# Altium integrated library WR-FPC_rev19a.IntLib: 242 symbols (part 2 of 2) (continued)
## 687130182122
designator J?
WR-FPC SMT ZIF Horizontal Dual Contact, pitch 0.5mm, 30p; Part Number: 687130182122; Contact Resistance: 30mOhm; Pin Number: 30; Working Voltage: 50VAC; Rated Current: 0.5A; ComponentLink1Description: Manufacturer; ComponentLink1URL: http://www.we-online.de; ComponentLink2Description: Datasheet; ComponentLink2URL: https://katalog.we-online.com/em/datasheet/687130182122.pdf; Packaging: Tape and Reel; Pitch: 0.5mm; Published Date: November 2019; Mounting Technology: SMT; Operating Temperature: -25 to +85degC; Length: 17mm; Type: Horizontal; Publisher: Wurth Elektronik
footprint 687130182122
pins: 1, 2, 3, 4, 5, 6, 7, 8, 9, 10, 11, 12, 13, 14, 15, 16, 17, 18, 19, 20, 21, 22, 23, 24, 25, 26, 27, 28, 29, 30, MP1, MP2

## 687130183622
designator J?
WR-FPC SMT ZIF Horizontal Top Contact Low Profile, pitch 0.5mm, 30p; Part Number: 687130183622; Contact Resistance: 30mOhm; Pin Number: 30; Working Voltage: 50VAC; Rated Current: 0.4A; ComponentLink1Description: Manufacturer; ComponentLink1URL: http://www.we-online.de; ComponentLink2Description: Datasheet; ComponentLink2URL: https://katalog.we-online.com/em/datasheet/687130183622.pdf; Packaging: Tape and Reel; Pitch: 0.5mm; Published Date: November 2019; Mounting Technology: SMT; Operating Temperature: -25 to +85degC; Length: 20.7mm; Type: Horizontal; Publisher: Wurth Elektronik
footprint 687130183622
pins: 1, 2, 3, 4, 5, 6, 7, 8, 9, 10, 11, 12, 13, 14, 15, 16, 17, 18, 19, 20, 21, 22, 23, 24, 25, 26, 27, 28, 29, 30, MP1, MP2

## 687130183722
designator J?
WR-FPC SMT ZIF Horizontal Bottom Contact Low Profile, pitch 0.5mm, 30p; Part Number: 687130183722; Contact Resistance: 30mOhm; Pin Number: 30; Working Voltage: 50VAC; Rated Current: 0.4A; ComponentLink1Description: Manufacturer; ComponentLink1URL: http://www.we-online.de; ComponentLink2Description: Datasheet; ComponentLink2URL: https://katalog.we-online.com/em/datasheet/687130183722.pdf; Packaging: Tape and Reel; Pitch: 0.5mm; Published Date: November 2019; Mounting Technology: SMT; Operating Temperature: -25 to +85degC; Length: 20.7mm; Type: Horizontal; Publisher: Wurth Elektronik
footprint 687130183722
pins: 1, 2, 3, 4, 5, 6, 7, 8, 9, 10, 11, 12, 13, 14, 15, 16, 17, 18, 19, 20, 21, 22, 23, 24, 25, 26, 27, 28, 29, 30, MP1, MP2

## 687132149022
designator J?
WR-FPC SMT ZIF Horizontal Bottom Contact, pitch 0.5mm, 32p; Part Number: 687132149022; Contact Resistance: 50mOhm; Pin Number: 32; Working Voltage: 50VAC; Rated Current: 0.5A; ComponentLink1Description: Manufacturer; ComponentLink1URL: http://www.we-online.de; ComponentLink2Description: Datasheet; ComponentLink2URL: https://katalog.we-online.com/em/datasheet/687132149022.pdf; Packaging: Tape and Reel; Pitch: 0.5mm; Published Date: November 2019; Mounting Technology: SMT; Operating Temperature: -25 to +85degC; Length: 20.1mm; Type: Horizontal; Publisher: Wurth Elektronik
footprint 687132149022
pins: 1, 2, 3, 4, 5, 6, 7, 8, 9, 10, 11, 12, 13, 14, 15, 16, 17, 18, 19, 20, 21, 22, 23, 24, 25, 26, 27, 28, 29, 30, 31, 32, MP1, MP2

## 687132183622
designator J?
WR-FPC SMT ZIF Horizontal Top Contact Low Profile, pitch 0.5mm, 32p; Part Number: 687132183622; Contact Resistance: 30mOhm; Pin Number: 32; Working Voltage: 50VAC; Rated Current: 0.4A; ComponentLink1Description: Manufacturer; ComponentLink1URL: http://www.we-online.de; ComponentLink2Description: Datasheet; ComponentLink2URL: https://katalog.we-online.com/em/datasheet/687132183622.pdf; Packaging: Tape and Reel; Pitch: 0.5mm; Published Date: November 2019; Mounting Technology: SMT; Operating Temperature: -25 to +85degC; Length: 21.7mm; Type: Horizontal; Publisher: Wurth Elektronik
footprint 687132183622
pins: 1, 2, 3, 4, 5, 6, 7, 8, 9, 10, 11, 12, 13, 14, 15, 16, 17, 18, 19, 20, 21, 22, 23, 24, 25, 26, 27, 28, 29, 30, 31, 32, MP1, MP2

## 687132183722
designator J?
WR-FPC SMT ZIF Horizontal Bottom Contact Low Profile, pitch 0.5mm, 32p; Part Number: 687132183722; Contact Resistance: 30mOhm; Pin Number: 32; Working Voltage: 50VAC; Rated Current: 0.4A; ComponentLink1Description: Manufacturer; ComponentLink1URL: http://www.we-online.de; ComponentLink2Description: Datasheet; ComponentLink2URL: https://katalog.we-online.com/em/datasheet/687132183722.pdf; Packaging: Tape and Reel; Pitch: 0.5mm; Published Date: November 2019; Mounting Technology: SMT; Operating Temperature: -25 to +85degC; Length: 21.7mm; Type: Horizontal; Publisher: Wurth Elektronik
footprint 687132183722
pins: 1, 2, 3, 4, 5, 6, 7, 8, 9, 10, 11, 12, 13, 14, 15, 16, 17, 18, 19, 20, 21, 22, 23, 24, 25, 26, 27, 28, 29, 30, 31, 32, MP1, MP2

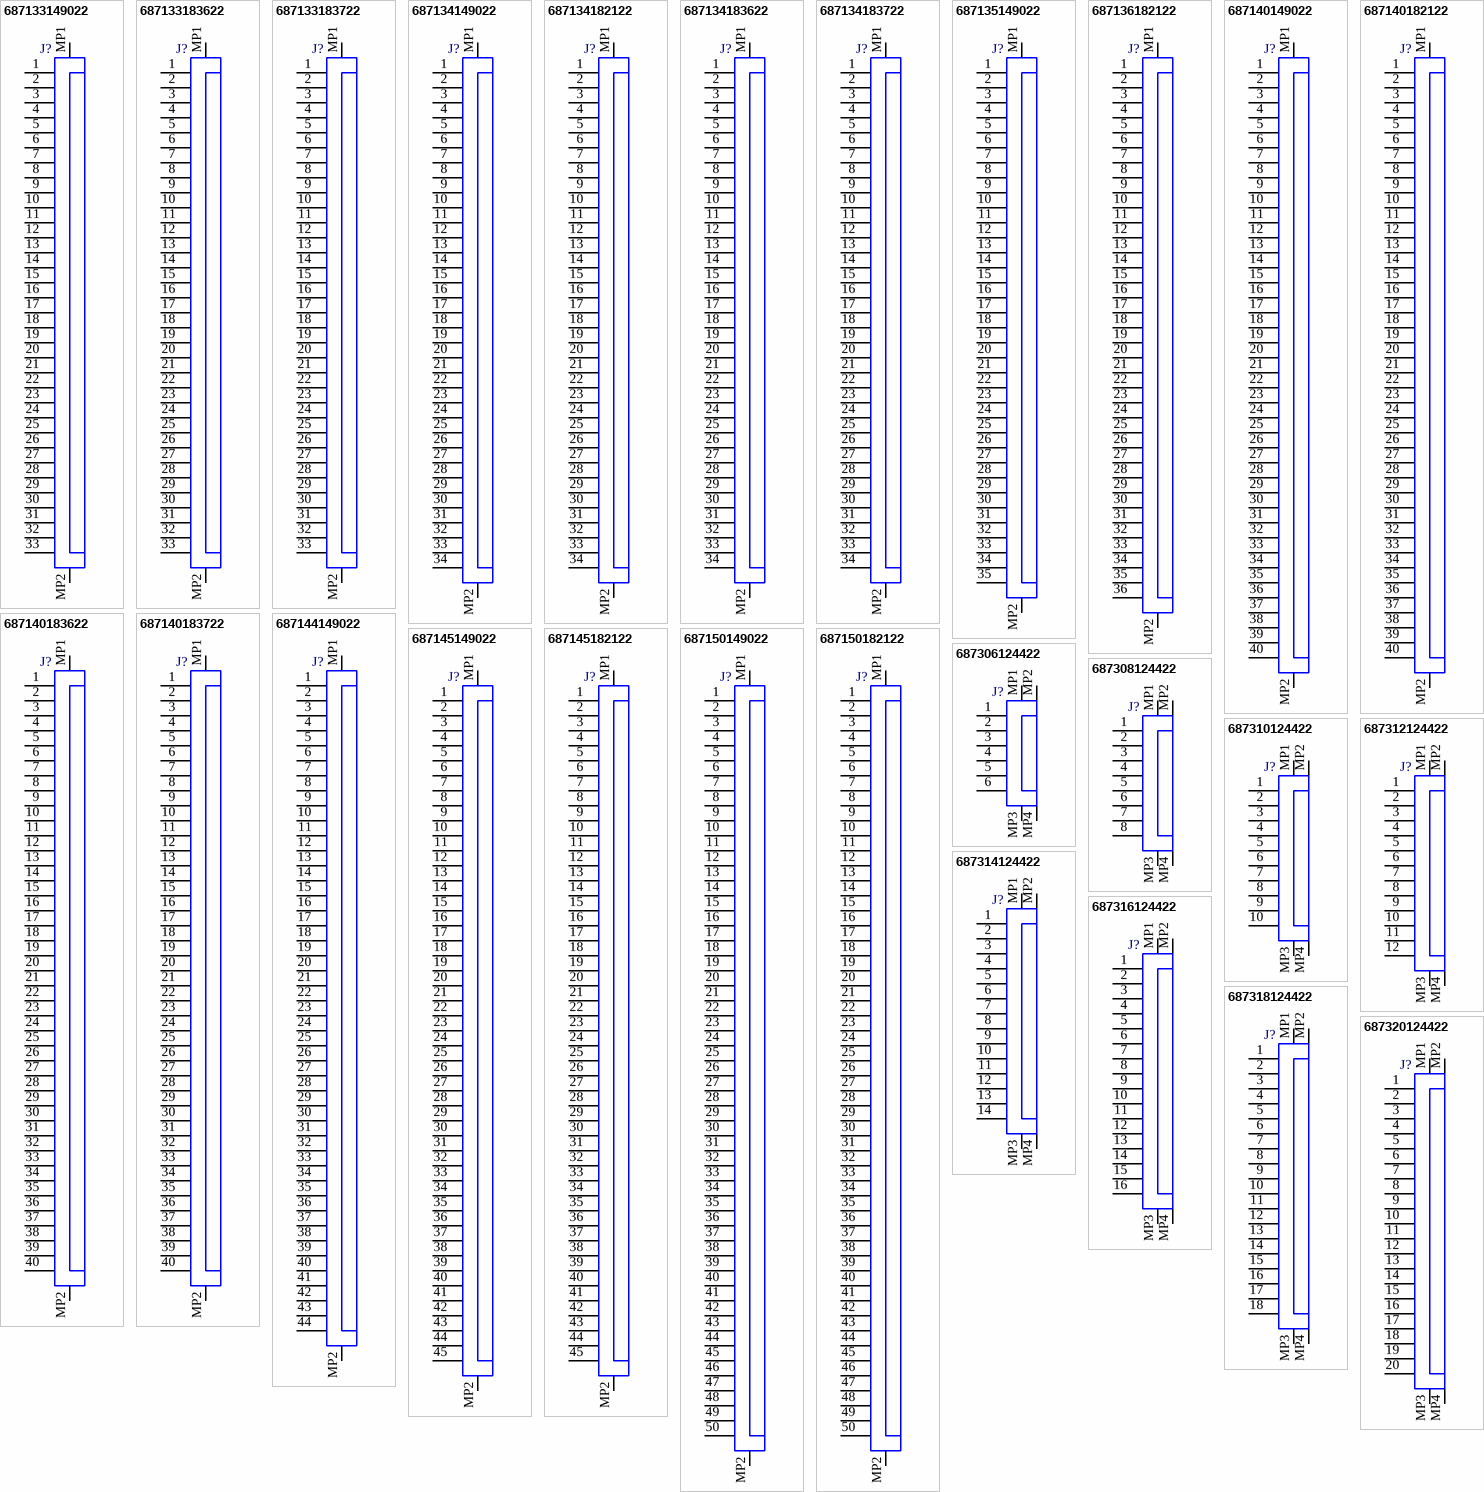
[diagram p6: symbols 687133149022 to 687320124422]

## 687133149022
designator J?
WR-FPC SMT ZIF Horizontal Bottom Contact, pitch 0.5mm, 33p; Part Number: 687133149022; Contact Resistance: 50mOhm; Pin Number: 33; Working Voltage: 50VAC; Rated Current: 0.5A; ComponentLink1Description: Manufacturer; ComponentLink1URL: http://www.we-online.de; ComponentLink2Description: Datasheet; ComponentLink2URL: https://katalog.we-online.com/em/datasheet/687133149022.pdf; Packaging: Tape and Reel; Pitch: 0.5mm; Published Date: November 2019; Mounting Technology: SMT; Operating Temperature: -25 to +85degC; Length: 20.6mm; Type: Horizontal; Publisher: Wurth Elektronik
footprint 687133149022
pins: 1, 2, 3, 4, 5, 6, 7, 8, 9, 10, 11, 12, 13, 14, 15, 16, 17, 18, 19, 20, 21, 22, 23, 24, 25, 26, 27, 28, 29, 30, 31, 32, 33, MP1, MP2

## 687133183622
designator J?
WR-FPC SMT ZIF Horizontal Top Contact Low Profile, pitch 0.5mm, 33p; Part Number: 687133183622; Contact Resistance: 30mOhm; Pin Number: 33; Working Voltage: 50VAC; Rated Current: 0.4A; ComponentLink1Description: Manufacturer; ComponentLink1URL: http://www.we-online.de; ComponentLink2Description: Datasheet; ComponentLink2URL: https://katalog.we-online.com/em/datasheet/687133183622.pdf; Packaging: Tape and Reel; Pitch: 0.5mm; Published Date: November 2019; Mounting Technology: SMT; Operating Temperature: -25 to +85degC; Length: 22.2mm; Type: Horizontal; Publisher: Wurth Elektronik
footprint 687133183622
pins: 1, 2, 3, 4, 5, 6, 7, 8, 9, 10, 11, 12, 13, 14, 15, 16, 17, 18, 19, 20, 21, 22, 23, 24, 25, 26, 27, 28, 29, 30, 31, 32, 33, MP1, MP2

## 687133183722
designator J?
WR-FPC SMT ZIF Horizontal Bottom Contact Low Profile, pitch 0.5mm, 33p; Part Number: 687133183722; Contact Resistance: 30mOhm; Pin Number: 33; Working Voltage: 50VAC; Rated Current: 0.4A; ComponentLink1Description: Manufacturer; ComponentLink1URL: http://www.we-online.de; ComponentLink2Description: Datasheet; ComponentLink2URL: https://katalog.we-online.com/em/datasheet/687133183722.pdf; Packaging: Tape and Reel; Pitch: 0.5mm; Published Date: November 2019; Mounting Technology: SMT; Operating Temperature: -25 to +85degC; Length: 22.2mm; Type: Horizontal; Publisher: Wurth Elektronik
footprint 687133183722
pins: 1, 2, 3, 4, 5, 6, 7, 8, 9, 10, 11, 12, 13, 14, 15, 16, 17, 18, 19, 20, 21, 22, 23, 24, 25, 26, 27, 28, 29, 30, 31, 32, 33, MP1, MP2

## 687134149022
designator J?
WR-FPC SMT ZIF Horizontal Bottom Contact, pitch 0.5mm, 34p; Part Number: 687134149022; Contact Resistance: 50mOhm; Pin Number: 34; Working Voltage: 50VAC; Rated Current: 0.5A; ComponentLink1Description: Manufacturer; ComponentLink1URL: http://www.we-online.de; ComponentLink2Description: Datasheet; ComponentLink2URL: https://katalog.we-online.com/em/datasheet/687134149022.pdf; Packaging: Tape and Reel; Pitch: 0.5mm; Published Date: November 2019; Mounting Technology: SMT; Operating Temperature: -25 to +85degC; Length: 21.1mm; Type: Horizontal; Publisher: Wurth Elektronik
footprint 687134149022
pins: 1, 2, 3, 4, 5, 6, 7, 8, 9, 10, 11, 12, 13, 14, 15, 16, 17, 18, 19, 20, 21, 22, 23, 24, 25, 26, 27, 28, 29, 30, 31, 32, 33, 34, MP1, MP2

## 687134182122
designator J?
WR-FPC SMT ZIF Horizontal Dual Contact, pitch 0.5mm, 34p; Part Number: 687134182122; Contact Resistance: 30mOhm; Pin Number: 34; Working Voltage: 50VAC; Rated Current: 0.5A; ComponentLink1Description: Manufacturer; ComponentLink1URL: http://www.we-online.de; ComponentLink2Description: Datasheet; ComponentLink2URL: https://katalog.we-online.com/em/datasheet/687134182122.pdf; Packaging: Tape and Reel; Pitch: 0.5mm; Published Date: November 2019; Mounting Technology: SMT; Operating Temperature: -25 to +85degC; Length: 19mm; Type: Horizontal; Publisher: Wurth Elektronik
footprint 687134182122
pins: 1, 2, 3, 4, 5, 6, 7, 8, 9, 10, 11, 12, 13, 14, 15, 16, 17, 18, 19, 20, 21, 22, 23, 24, 25, 26, 27, 28, 29, 30, 31, 32, 33, 34, MP1, MP2

## 687134183622
designator J?
WR-FPC SMT ZIF Horizontal Top Contact Low Profile, pitch 0.5mm, 34p; Part Number: 687134183622; Contact Resistance: 30mOhm; Pin Number: 34; Working Voltage: 50VAC; Rated Current: 0.4A; ComponentLink1Description: Manufacturer; ComponentLink1URL: http://www.we-online.de; ComponentLink2Description: Datasheet; ComponentLink2URL: https://katalog.we-online.com/em/datasheet/687134183622.pdf; Packaging: Tape and Reel; Pitch: 0.5mm; Published Date: November 2019; Mounting Technology: SMT; Operating Temperature: -25 to +85degC; Length: 22.7mm; Type: Horizontal; Publisher: Wurth Elektronik
footprint 687134183622
pins: 1, 2, 3, 4, 5, 6, 7, 8, 9, 10, 11, 12, 13, 14, 15, 16, 17, 18, 19, 20, 21, 22, 23, 24, 25, 26, 27, 28, 29, 30, 31, 32, 33, 34, MP1, MP2

## 687134183722
designator J?
WR-FPC SMT ZIF Horizontal Bottom Contact Low Profile, pitch 0.5mm, 34p; Part Number: 687134183722; Contact Resistance: 30mOhm; Pin Number: 34; Working Voltage: 50VAC; Rated Current: 0.4A; ComponentLink1Description: Manufacturer; ComponentLink1URL: http://www.we-online.de; ComponentLink2Description: Datasheet; ComponentLink2URL: https://katalog.we-online.com/em/datasheet/687134183722.pdf; Packaging: Tape and Reel; Pitch: 0.5mm; Published Date: November 2019; Mounting Technology: SMT; Operating Temperature: -25 to +85degC; Length: 22.7mm; Type: Horizontal; Publisher: Wurth Elektronik
footprint 687134183722
pins: 1, 2, 3, 4, 5, 6, 7, 8, 9, 10, 11, 12, 13, 14, 15, 16, 17, 18, 19, 20, 21, 22, 23, 24, 25, 26, 27, 28, 29, 30, 31, 32, 33, 34, MP1, MP2

## 687135149022
designator J?
WR-FPC SMT ZIF Horizontal Bottom Contact, pitch 0.5mm, 35p; Part Number: 687135149022; Contact Resistance: 50mOhm; Pin Number: 35; Working Voltage: 50VAC; Rated Current: 0.5A; ComponentLink1Description: Manufacturer; ComponentLink1URL: http://www.we-online.de; ComponentLink2Description: Datasheet; ComponentLink2URL: https://katalog.we-online.com/em/datasheet/687135149022.pdf; Packaging: Tape and Reel; Pitch: 0.5mm; Published Date: November 2019; Mounting Technology: SMT; Operating Temperature: -25 to +85degC; Length: 21.6mm; Type: Horizontal; Publisher: Wurth Elektronik
footprint 687135149022
pins: 1, 2, 3, 4, 5, 6, 7, 8, 9, 10, 11, 12, 13, 14, 15, 16, 17, 18, 19, 20, 21, 22, 23, 24, 25, 26, 27, 28, 29, 30, 31, 32, 33, 34, 35, MP1, MP2

## 687136182122
designator J?
WR-FPC SMT ZIF Horizontal Dual Contact, pitch 0.5mm, 36p; Part Number: 687136182122; Contact Resistance: 30mOhm; Pin Number: 36; Working Voltage: 50VAC; Rated Current: 0.5A; ComponentLink1Description: Manufacturer; ComponentLink1URL: http://www.we-online.de; ComponentLink2Description: Datasheet; ComponentLink2URL: https://katalog.we-online.com/em/datasheet/687136182122.pdf; Packaging: Tape and Reel; Pitch: 0.5mm; Published Date: November 2019; Mounting Technology: SMT; Operating Temperature: -25 to +85degC; Length: 20mm; Type: Horizontal; Publisher: Wurth Elektronik
footprint 687136182122
pins: 1, 2, 3, 4, 5, 6, 7, 8, 9, 10, 11, 12, 13, 14, 15, 16, 17, 18, 19, 20, 21, 22, 23, 24, 25, 26, 27, 28, 29, 30, 31, 32, 33, 34, 35, 36, MP1, MP2

## 687140149022
designator J?
WR-FPC SMT ZIF Horizontal Bottom Contact, pitch 0.5mm, 40p; Part Number: 687140149022; Contact Resistance: 50mOhm; Pin Number: 40; Working Voltage: 50VAC; Rated Current: 0.5A; ComponentLink1Description: Manufacturer; ComponentLink1URL: http://www.we-online.de; ComponentLink2Description: Datasheet; ComponentLink2URL: https://katalog.we-online.com/em/datasheet/687140149022.pdf; Packaging: Tape and Reel; Pitch: 0.5mm; Published Date: November 2019; Mounting Technology: SMT; Operating Temperature: -25 to +85degC; Length: 24.1mm; Type: Horizontal; Publisher: Wurth Elektronik
footprint 687140149022
pins: 1, 2, 3, 4, 5, 6, 7, 8, 9, 10, 11, 12, 13, 14, 15, 16, 17, 18, 19, 20, 21, 22, 23, 24, 25, 26, 27, 28, 29, 30, 31, 32, 33, 34, 35, 36, 37, 38, 39, 40, MP1, MP2

## 687140182122
designator J?
WR-FPC SMT ZIF Horizontal Dual Contact, pitch 0.5mm, 40p; Part Number: 687140182122; Contact Resistance: 30mOhm; Pin Number: 40; Working Voltage: 50VAC; Rated Current: 0.5A; ComponentLink1Description: Manufacturer; ComponentLink1URL: http://www.we-online.de; ComponentLink2Description: Datasheet; ComponentLink2URL: https://katalog.we-online.com/em/datasheet/687140182122.pdf; Packaging: Tape and Reel; Pitch: 0.5mm; Published Date: November 2019; Mounting Technology: SMT; Operating Temperature: -25 to +85degC; Length: 22mm; Type: Horizontal; Publisher: Wurth Elektronik
footprint 687140182122
pins: 1, 2, 3, 4, 5, 6, 7, 8, 9, 10, 11, 12, 13, 14, 15, 16, 17, 18, 19, 20, 21, 22, 23, 24, 25, 26, 27, 28, 29, 30, 31, 32, 33, 34, 35, 36, 37, 38, 39, 40, MP1, MP2

## 687140183622
designator J?
WR-FPC SMT ZIF Horizontal Top Contact Low Profile, pitch 0.5mm, 40p; Part Number: 687140183622; Contact Resistance: 30mOhm; Pin Number: 40; Working Voltage: 50VAC; Rated Current: 0.4A; ComponentLink1Description: Manufacturer; ComponentLink1URL: http://www.we-online.de; ComponentLink2Description: Datasheet; ComponentLink2URL: https://katalog.we-online.com/em/datasheet/687140183622.pdf; Packaging: Tape and Reel; Pitch: 0.5mm; Published Date: November 2019; Mounting Technology: SMT; Operating Temperature: -25 to +85degC; Length: 25.7mm; Type: Horizontal; Publisher: Wurth Elektronik
footprint 687140183622
pins: 1, 2, 3, 4, 5, 6, 7, 8, 9, 10, 11, 12, 13, 14, 15, 16, 17, 18, 19, 20, 21, 22, 23, 24, 25, 26, 27, 28, 29, 30, 31, 32, 33, 34, 35, 36, 37, 38, 39, 40, MP1, MP2

## 687140183722
designator J?
WR-FPC SMT ZIF Horizontal Bottom Contact Low Profile, pitch 0.5mm, 40p; Part Number: 687140183722; Contact Resistance: 30mOhm; Pin Number: 40; Working Voltage: 50VAC; Rated Current: 0.4A; ComponentLink1Description: Manufacturer; ComponentLink1URL: http://www.we-online.de; ComponentLink2Description: Datasheet; ComponentLink2URL: https://katalog.we-online.com/em/datasheet/687140183722.pdf; Packaging: Tape and Reel; Pitch: 0.5mm; Published Date: November 2019; Mounting Technology: SMT; Operating Temperature: -25 to +85degC; Length: 25.7mm; Type: Horizontal; Publisher: Wurth Elektronik
footprint 687140183722
pins: 1, 2, 3, 4, 5, 6, 7, 8, 9, 10, 11, 12, 13, 14, 15, 16, 17, 18, 19, 20, 21, 22, 23, 24, 25, 26, 27, 28, 29, 30, 31, 32, 33, 34, 35, 36, 37, 38, 39, 40, MP1, MP2

## 687144149022
designator J?
WR-FPC SMT ZIF Horizontal Bottom Contact, pitch 0.5mm, 44p; Part Number: 687144149022; Contact Resistance: 50mOhm; Pin Number: 44; Working Voltage: 50VAC; Rated Current: 0.5A; ComponentLink1Description: Manufacturer; ComponentLink1URL: http://www.we-online.de; ComponentLink2Description: Datasheet; ComponentLink2URL: https://katalog.we-online.com/em/datasheet/687144149022.pdf; Packaging: Tape and Reel; Pitch: 0.5mm; Published Date: November 2019; Mounting Technology: SMT; Operating Temperature: -25 to +85degC; Length: 26.1mm; Type: Horizontal; Publisher: Wurth Elektronik
footprint 687144149022
pins: 1, 2, 3, 4, 5, 6, 7, 8, 9, 10, 11, 12, 13, 14, 15, 16, 17, 18, 19, 20, 21, 22, 23, 24, 25, 26, 27, 28, 29, 30, 31, 32, 33, 34, 35, 36, 37, 38, 39, 40, 41, 42, 43, 44, MP1, MP2

## 687145149022
designator J?
WR-FPC SMT ZIF Horizontal Bottom Contact, pitch 0.5mm, 45p; Part Number: 687145149022; Contact Resistance: 50mOhm; Pin Number: 45; Working Voltage: 50VAC; Rated Current: 0.5A; ComponentLink1Description: Manufacturer; ComponentLink1URL: http://www.we-online.de; ComponentLink2Description: Datasheet; ComponentLink2URL: https://katalog.we-online.com/em/datasheet/687145149022.pdf; Packaging: Tape and Reel; Pitch: 0.5mm; Published Date: November 2019; Mounting Technology: SMT; Operating Temperature: -25 to +85degC; Length: 26.6mm; Type: Horizontal; Publisher: Wurth Elektronik
footprint 687145149022
pins: 1, 2, 3, 4, 5, 6, 7, 8, 9, 10, 11, 12, 13, 14, 15, 16, 17, 18, 19, 20, 21, 22, 23, 24, 25, 26, 27, 28, 29, 30, 31, 32, 33, 34, 35, 36, 37, 38, 39, 40, 41, 42, 43, 44, 45, MP1, MP2

## 687145182122
designator J?
WR-FPC SMT ZIF Horizontal Dual Contact, pitch 0.5mm, 45p; Part Number: 687145182122; Contact Resistance: 30mOhm; Pin Number: 45; Working Voltage: 50VAC; Rated Current: 0.5A; ComponentLink1Description: Manufacturer; ComponentLink1URL: http://www.we-online.de; ComponentLink2Description: Datasheet; ComponentLink2URL: https://katalog.we-online.com/em/datasheet/687145182122.pdf; Packaging: Tape and Reel; Pitch: 0.5mm; Published Date: November 2019; Mounting Technology: SMT; Operating Temperature: -25 to +85degC; Length: 24.5mm; Type: Horizontal; Publisher: Wurth Elektronik
footprint 687145182122
pins: 1, 2, 3, 4, 5, 6, 7, 8, 9, 10, 11, 12, 13, 14, 15, 16, 17, 18, 19, 20, 21, 22, 23, 24, 25, 26, 27, 28, 29, 30, 31, 32, 33, 34, 35, 36, 37, 38, 39, 40, 41, 42, 43, 44, 45, MP1, MP2

## 687150149022
designator J?
WR-FPC SMT ZIF Horizontal Bottom Contact, pitch 0.5mm, 50p; Part Number: 687150149022; Contact Resistance: 50mOhm; Pin Number: 50; Working Voltage: 50VAC; Rated Current: 0.5A; ComponentLink1Description: Manufacturer; ComponentLink1URL: http://www.we-online.de; ComponentLink2Description: Datasheet; ComponentLink2URL: https://katalog.we-online.com/em/datasheet/687150149022.pdf; Packaging: Tape and Reel; Pitch: 0.5mm; Published Date: November 2019; Mounting Technology: SMT; Operating Temperature: -25 to +85degC; Length: 29.1mm; Type: Horizontal; Publisher: Wurth Elektronik
footprint 687150149022
pins: 1, 2, 3, 4, 5, 6, 7, 8, 9, 10, 11, 12, 13, 14, 15, 16, 17, 18, 19, 20, 21, 22, 23, 24, 25, 26, 27, 28, 29, 30, 31, 32, 33, 34, 35, 36, 37, 38, 39, 40, 41, 42, 43, 44, 45, 46, 47, 48, 49, 50, MP1, MP2

## 687150182122
designator J?
WR-FPC SMT ZIF Horizontal Dual Contact, pitch 0.5mm, 50p; Part Number: 687150182122; Contact Resistance: 30mOhm; Pin Number: 50; Working Voltage: 50VAC; Rated Current: 0.5A; ComponentLink1Description: Manufacturer; ComponentLink1URL: http://www.we-online.de; ComponentLink2Description: Datasheet; ComponentLink2URL: https://katalog.we-online.com/em/datasheet/687150182122.pdf; Packaging: Tape and Reel; Pitch: 0.5mm; Published Date: November 2019; Mounting Technology: SMT; Operating Temperature: -25 to +85degC; Length: 27mm; Type: Horizontal; Publisher: Wurth Elektronik
footprint 687150182122
pins: 1, 2, 3, 4, 5, 6, 7, 8, 9, 10, 11, 12, 13, 14, 15, 16, 17, 18, 19, 20, 21, 22, 23, 24, 25, 26, 27, 28, 29, 30, 31, 32, 33, 34, 35, 36, 37, 38, 39, 40, 41, 42, 43, 44, 45, 46, 47, 48, 49, 50, MP1, MP2

## 687306124422
designator J?
WR-FPC SMT ZIF Vertical, pitch 0.5mm, 6p; Part Number: 687306124422; Contact Resistance: 20mOhm; Pin Number: 6; Working Voltage: 50VAC; Rated Current: 0.5A; ComponentLink1Description: Manufacturer; ComponentLink1URL: http://www.we-online.de; ComponentLink2Description: Datasheet; ComponentLink2URL: https://katalog.we-online.com/em/datasheet/687306124422.pdf; Packaging: Tape and Reel; Pitch: 0.5mm; Published Date: November 2019; Mounting Technology: SMT; Operating Temperature: -25 to +85degC; Length: 9.4mm; Type: Vertical; Publisher: Wurth Elektronik
footprint 687306124422
pins: 1, 2, 3, 4, 5, 6, MP1, MP2, MP3, MP4

## 687308124422
designator J?
WR-FPC SMT ZIF Vertical, pitch 0.5mm, 8p; Part Number: 687308124422; Contact Resistance: 20mOhm; Pin Number: 8; Working Voltage: 50VAC; Rated Current: 0.5A; ComponentLink1Description: Manufacturer; ComponentLink1URL: http://www.we-online.de; ComponentLink2Description: Datasheet; ComponentLink2URL: https://katalog.we-online.com/em/datasheet/687308124422.pdf; Packaging: Tape and Reel; Pitch: 0.5mm; Published Date: November 2019; Mounting Technology: SMT; Operating Temperature: -25 to +85degC; Length: 10.4mm; Type: Vertical; Publisher: Wurth Elektronik
footprint 687308124422
pins: 1, 2, 3, 4, 5, 6, 7, 8, MP1, MP2, MP3, MP4

## 687310124422
designator J?
WR-FPC SMT ZIF Vertical, pitch 0.5mm, 10p; Part Number: 687310124422; Contact Resistance: 20mOhm; Pin Number: 10; Working Voltage: 50VAC; Rated Current: 0.5A; ComponentLink1Description: Manufacturer; ComponentLink1URL: http://www.we-online.de; ComponentLink2Description: Datasheet; ComponentLink2URL: https://katalog.we-online.com/em/datasheet/687310124422.pdf; Packaging: Tape and Reel; Pitch: 0.5mm; Published Date: November 2019; Mounting Technology: SMT; Operating Temperature: -25 to +85degC; Length: 11.4mm; Type: Vertical; Publisher: Wurth Elektronik
footprint 687310124422
pins: 1, 2, 3, 4, 5, 6, 7, 8, 9, 10, MP1, MP2, MP3, MP4

## 687312124422
designator J?
WR-FPC SMT ZIF Vertical, pitch 0.5mm, 12p; Part Number: 687312124422; Contact Resistance: 20mOhm; Pin Number: 12; Working Voltage: 50VAC; Rated Current: 0.5A; ComponentLink1Description: Manufacturer; ComponentLink1URL: http://www.we-online.de; ComponentLink2Description: Datasheet; ComponentLink2URL: https://katalog.we-online.com/em/datasheet/687312124422.pdf; Packaging: Tape and Reel; Pitch: 0.5mm; Published Date: November 2019; Mounting Technology: SMT; Operating Temperature: -25 to +85degC; Length: 12.4mm; Type: Vertical; Publisher: Wurth Elektronik
footprint 687312124422
pins: 1, 2, 3, 4, 5, 6, 7, 8, 9, 10, 11, 12, MP1, MP2, MP3, MP4

## 687314124422
designator J?
WR-FPC SMT ZIF Vertical, pitch 0.5mm, 14p; Part Number: 687314124422; Contact Resistance: 20mOhm; Pin Number: 14; Working Voltage: 50VAC; Rated Current: 0.5A; ComponentLink1Description: Manufacturer; ComponentLink1URL: http://www.we-online.de; ComponentLink2Description: Datasheet; ComponentLink2URL: https://katalog.we-online.com/em/datasheet/687314124422.pdf; Packaging: Tape and Reel; Pitch: 0.5mm; Published Date: November 2019; Mounting Technology: SMT; Operating Temperature: -25 to +85degC; Length: 13.4mm; Type: Vertical; Publisher: Wurth Elektronik
footprint 687314124422
pins: 1, 2, 3, 4, 5, 6, 7, 8, 9, 10, 11, 12, 13, 14, MP1, MP2, MP3, MP4

## 687316124422
designator J?
WR-FPC SMT ZIF Vertical, pitch 0.5mm, 16p; Part Number: 687316124422; Contact Resistance: 20mOhm; Pin Number: 16; Working Voltage: 50VAC; Rated Current: 0.5A; ComponentLink1Description: Manufacturer; ComponentLink1URL: http://www.we-online.de; ComponentLink2Description: Datasheet; ComponentLink2URL: https://katalog.we-online.com/em/datasheet/687316124422.pdf; Packaging: Tape and Reel; Pitch: 0.5mm; Published Date: November 2019; Mounting Technology: SMT; Operating Temperature: -25 to +85degC; Length: 14.4mm; Type: Vertical; Publisher: Wurth Elektronik
footprint 687316124422
pins: 1, 2, 3, 4, 5, 6, 7, 8, 9, 10, 11, 12, 13, 14, 15, 16, MP1, MP2, MP3, MP4

## 687318124422
designator J?
WR-FPC SMT ZIF Vertical, pitch 0.5mm, 18p; Part Number: 687318124422; Contact Resistance: 20mOhm; Pin Number: 18; Working Voltage: 50VAC; Rated Current: 0.5A; ComponentLink1Description: Manufacturer; ComponentLink1URL: http://www.we-online.de; ComponentLink2Description: Datasheet; ComponentLink2URL: https://katalog.we-online.com/em/datasheet/687318124422.pdf; Packaging: Tape and Reel; Pitch: 0.5mm; Published Date: November 2019; Mounting Technology: SMT; Operating Temperature: -25 to +85degC; Length: 15.4mm; Type: Vertical; Publisher: Wurth Elektronik
footprint 687318124422
pins: 1, 2, 3, 4, 5, 6, 7, 8, 9, 10, 11, 12, 13, 14, 15, 16, 17, 18, MP1, MP2, MP3, MP4

## 687320124422
designator J?
WR-FPC SMT ZIF Vertical, pitch 0.5mm, 20p; Part Number: 687320124422; Contact Resistance: 20mOhm; Pin Number: 20; Working Voltage: 50VAC; Rated Current: 0.5A; ComponentLink1Description: Manufacturer; ComponentLink1URL: http://www.we-online.de; ComponentLink2Description: Datasheet; ComponentLink2URL: https://katalog.we-online.com/em/datasheet/687320124422.pdf; Packaging: Tape and Reel; Pitch: 0.5mm; Published Date: November 2019; Mounting Technology: SMT; Operating Temperature: -25 to +85degC; Length: 16.4mm; Type: Vertical; Publisher: Wurth Elektronik
footprint 687320124422
pins: 1, 2, 3, 4, 5, 6, 7, 8, 9, 10, 11, 12, 13, 14, 15, 16, 17, 18, 19, 20, MP1, MP2, MP3, MP4

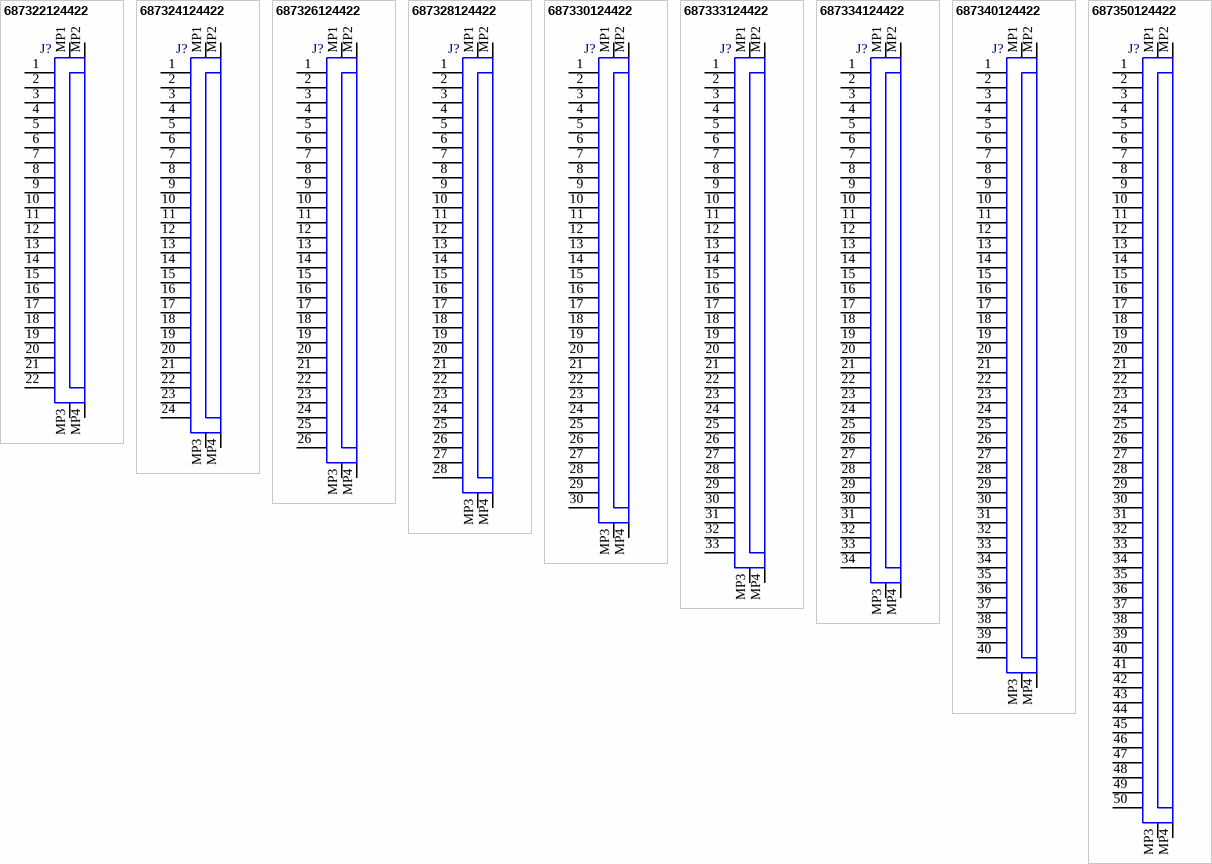
[diagram p7: symbols 687322124422 to 687350124422]

## 687322124422
designator J?
WR-FPC SMT ZIF Vertical, pitch 0.5mm, 22p; Part Number: 687322124422; Contact Resistance: 20mOhm; Pin Number: 22; Working Voltage: 50VAC; Rated Current: 0.5A; ComponentLink1Description: Manufacturer; ComponentLink1URL: http://www.we-online.de; ComponentLink2Description: Datasheet; ComponentLink2URL: https://katalog.we-online.com/em/datasheet/687322124422.pdf; Packaging: Tape and Reel; Pitch: 0.5mm; Published Date: November 2019; Mounting Technology: SMT; Operating Temperature: -25 to +85degC; Length: 17.4mm; Type: Vertical; Publisher: Wurth Elektronik
footprint 687322124422
pins: 1, 2, 3, 4, 5, 6, 7, 8, 9, 10, 11, 12, 13, 14, 15, 16, 17, 18, 19, 20, 21, 22, MP1, MP2, MP3, MP4

## 687324124422
designator J?
WR-FPC SMT ZIF Vertical, pitch 0.5mm, 24p; Part Number: 687324124422; Contact Resistance: 20mOhm; Pin Number: 24; Working Voltage: 50VAC; Rated Current: 0.5A; ComponentLink1Description: Manufacturer; ComponentLink1URL: http://www.we-online.de; ComponentLink2Description: Datasheet; ComponentLink2URL: https://katalog.we-online.com/em/datasheet/687324124422.pdf; Packaging: Tape and Reel; Pitch: 0.5mm; Published Date: November 2019; Mounting Technology: SMT; Operating Temperature: -25 to +85degC; Length: 18.4mm; Type: Vertical; Publisher: Wurth Elektronik
footprint 687324124422
pins: 1, 2, 3, 4, 5, 6, 7, 8, 9, 10, 11, 12, 13, 14, 15, 16, 17, 18, 19, 20, 21, 22, 23, 24, MP1, MP2, MP3, MP4

## 687326124422
designator J?
WR-FPC SMT ZIF Vertical, pitch 0.5mm, 26p; Part Number: 687326124422; Contact Resistance: 20mOhm; Pin Number: 26; Working Voltage: 50VAC; Rated Current: 0.5A; ComponentLink1Description: Manufacturer; ComponentLink1URL: http://www.we-online.de; ComponentLink2Description: Datasheet; ComponentLink2URL: https://katalog.we-online.com/em/datasheet/687326124422.pdf; Packaging: Tape and Reel; Pitch: 0.5mm; Published Date: November 2019; Mounting Technology: SMT; Operating Temperature: -25 to +85degC; Length: 19.4mm; Type: Vertical; Publisher: Wurth Elektronik
footprint 687326124422
pins: 1, 2, 3, 4, 5, 6, 7, 8, 9, 10, 11, 12, 13, 14, 15, 16, 17, 18, 19, 20, 21, 22, 23, 24, 25, 26, MP1, MP2, MP3, MP4

## 687328124422
designator J?
WR-FPC SMT ZIF Vertical, pitch 0.5mm, 28p; Part Number: 687328124422; Contact Resistance: 20mOhm; Pin Number: 28; Working Voltage: 50VAC; Rated Current: 0.5A; ComponentLink1Description: Manufacturer; ComponentLink1URL: http://www.we-online.de; ComponentLink2Description: Datasheet; ComponentLink2URL: https://katalog.we-online.com/em/datasheet/687328124422.pdf; Packaging: Tape and Reel; Pitch: 0.5mm; Published Date: November 2019; Mounting Technology: SMT; Operating Temperature: -25 to +85degC; Length: 20.4mm; Type: Vertical; Publisher: Wurth Elektronik
footprint 687328124422
pins: 1, 2, 3, 4, 5, 6, 7, 8, 9, 10, 11, 12, 13, 14, 15, 16, 17, 18, 19, 20, 21, 22, 23, 24, 25, 26, 27, 28, MP1, MP2, MP3, MP4

## 687330124422
designator J?
WR-FPC SMT ZIF Vertical, pitch 0.5mm, 30p; Part Number: 687330124422; Contact Resistance: 20mOhm; Pin Number: 30; Working Voltage: 50VAC; Rated Current: 0.5A; ComponentLink1Description: Manufacturer; ComponentLink1URL: http://www.we-online.de; ComponentLink2Description: Datasheet; ComponentLink2URL: https://katalog.we-online.com/em/datasheet/687330124422.pdf; Packaging: Tape and Reel; Pitch: 0.5mm; Published Date: November 2019; Mounting Technology: SMT; Operating Temperature: -25 to +85degC; Length: 21.4mm; Type: Vertical; Publisher: Wurth Elektronik
footprint 687330124422
pins: 1, 2, 3, 4, 5, 6, 7, 8, 9, 10, 11, 12, 13, 14, 15, 16, 17, 18, 19, 20, 21, 22, 23, 24, 25, 26, 27, 28, 29, 30, MP1, MP2, MP3, MP4

## 687333124422
designator J?
WR-FPC SMT ZIF Vertical, pitch 0.5mm, 33p; Part Number: 687333124422; Contact Resistance: 20mOhm; Pin Number: 33; Working Voltage: 50VAC; Rated Current: 0.5A; ComponentLink1Description: Manufacturer; ComponentLink1URL: http://www.we-online.de; ComponentLink2Description: Datasheet; ComponentLink2URL: https://katalog.we-online.com/em/datasheet/687333124422.pdf; Packaging: Tape and Reel; Pitch: 0.5mm; Published Date: November 2019; Mounting Technology: SMT; Operating Temperature: -25 to +85degC; Length: 22.9mm; Type: Vertical; Publisher: Wurth Elektronik
footprint 687333124422
pins: 1, 2, 3, 4, 5, 6, 7, 8, 9, 10, 11, 12, 13, 14, 15, 16, 17, 18, 19, 20, 21, 22, 23, 24, 25, 26, 27, 28, 29, 30, 31, 32, 33, MP1, MP2, MP3, MP4

## 687334124422
designator J?
WR-FPC SMT ZIF Vertical, pitch 0.5mm, 34p; Part Number: 687334124422; Contact Resistance: 20mOhm; Pin Number: 34; Working Voltage: 50VAC; Rated Current: 0.5A; ComponentLink1Description: Manufacturer; ComponentLink1URL: http://www.we-online.de; ComponentLink2Description: Datasheet; ComponentLink2URL: https://katalog.we-online.com/em/datasheet/687334124422.pdf; Packaging: Tape and Reel; Pitch: 0.5mm; Published Date: November 2019; Mounting Technology: SMT; Operating Temperature: -25 to +85degC; Length: 23.4mm; Type: Vertical; Publisher: Wurth Elektronik
footprint 687334124422
pins: 1, 2, 3, 4, 5, 6, 7, 8, 9, 10, 11, 12, 13, 14, 15, 16, 17, 18, 19, 20, 21, 22, 23, 24, 25, 26, 27, 28, 29, 30, 31, 32, 33, 34, MP1, MP2, MP3, MP4

## 687340124422
designator J?
WR-FPC SMT ZIF Vertical, pitch 0.5mm, 40p; Part Number: 687340124422; Contact Resistance: 20mOhm; Pin Number: 40; Working Voltage: 50VAC; Rated Current: 0.5A; ComponentLink1Description: Manufacturer; ComponentLink1URL: http://www.we-online.de; ComponentLink2Description: Datasheet; ComponentLink2URL: https://katalog.we-online.com/em/datasheet/687340124422.pdf; Packaging: Tape and Reel; Pitch: 0.5mm; Published Date: November 2019; Mounting Technology: SMT; Operating Temperature: -25 to +85degC; Length: 26.4mm; Type: Vertical; Publisher: Wurth Elektronik
footprint 687340124422
pins: 1, 2, 3, 4, 5, 6, 7, 8, 9, 10, 11, 12, 13, 14, 15, 16, 17, 18, 19, 20, 21, 22, 23, 24, 25, 26, 27, 28, 29, 30, 31, 32, 33, 34, 35, 36, 37, 38, 39, 40, MP1, MP2, MP3, MP4

## 687350124422
designator J?
WR-FPC SMT ZIF Vertical, pitch 0.5mm, 50p; Part Number: 687350124422; Contact Resistance: 20mOhm; Pin Number: 50; Working Voltage: 50VAC; Rated Current: 0.5A; ComponentLink1Description: Manufacturer; ComponentLink1URL: http://www.we-online.de; ComponentLink2Description: Datasheet; ComponentLink2URL: https://katalog.we-online.com/em/datasheet/687350124422.pdf; Packaging: Tape and Reel; Pitch: 0.5mm; Published Date: November 2019; Mounting Technology: SMT; Operating Temperature: -25 to +85degC; Length: 31.4mm; Type: Vertical; Publisher: Wurth Elektronik
footprint 687350124422
pins: 1, 2, 3, 4, 5, 6, 7, 8, 9, 10, 11, 12, 13, 14, 15, 16, 17, 18, 19, 20, 21, 22, 23, 24, 25, 26, 27, 28, 29, 30, 31, 32, 33, 34, 35, 36, 37, 38, 39, 40, 41, 42, 43, 44, 45, 46, 47, 48, 49, 50, MP1, MP2, MP3, MP4